# Altium footprint library 8-Crystals.PcbLib: 104 footprints (part 1 of 7)
Each footprint in its own frame and in the unit in brackets; x right, y up, seen from the top. Pads: shape width x height; smd on the part's side, far side on the other; paste and mask are expansions set on the pad; w line width, h text height; cw(c..) or ccw(c..) is an arc to the next point about the centre after c.
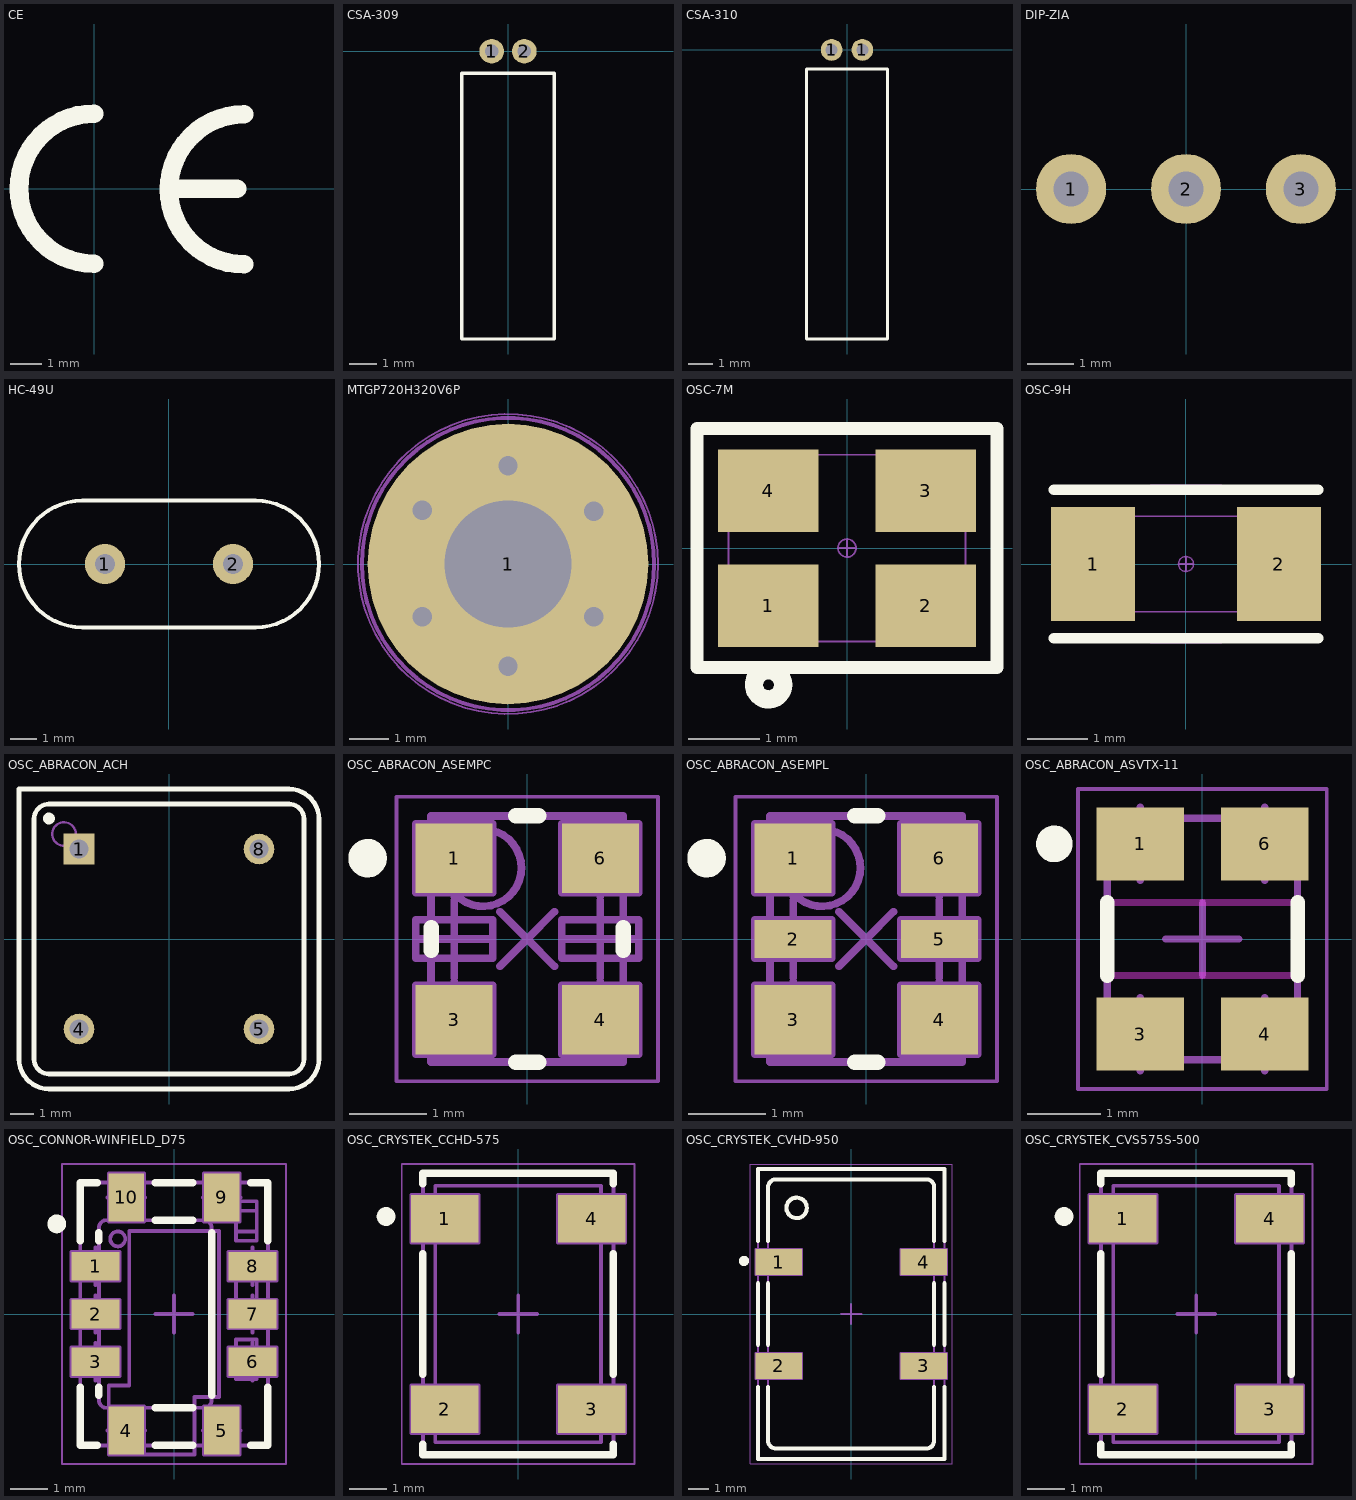
[diagram p0: the footprints below, top view; thin cyan lines are the x and y axes]

## CE [mm]
Top Overlay:
  lines w0.6: 0,-2.413 cw(c0,0) 0,2.413 ; 2.53,0 4.6,0 ; 4.826,-2.438 cw(c4.826,-0.025) 4.826,2.388
3D body "ce.stp": height 0.02, standoff 0, extent -2.725,-2.725 4.82,2.725

## CSA-309 [mm]
height 5.98
pads (2):
  round 0.9 hole 0.5: 1(-0.6,-0.004) 2(0.6,-0.004)
Top Overlay:
  lines w0.127: -1.702,-10.541 -1.702,-0.8 1.702,-0.8 1.702,-10.541 -1.702,-10.541
3D body "csa-309.stp": height 3.2, standoff -3.04, extent -1.625,-10.455 1.574,0.054
3D body "v090-050.stp": height 0.02, standoff -1.65, extent -1.05,-0.454 -0.15,0.446
3D body "v090-050.stp": height 0.02, standoff -1.65, extent 0.15,-0.453 1.05,0.446

## CSA-310 [mm]
height 5.98
pads (2):
  round 0.9 hole 0.5: 1(-0.635,0) 1(0.635,0)
Top Overlay:
  lines w0.127: -1.676,-11.963 1.676,-11.963 1.676,-0.8 -1.676,-0.8 -1.676,-11.963
3D body "v090-050.stp": height 0.02, standoff -1.65, extent 0.185,-0.45 1.085,0.45
3D body "v090-050.stp": height 0.02, standoff -1.65, extent -1.085,-0.45 -0.185,0.45
3D body "csa-310l.stp": height 3.2, standoff -3.04, extent -1.6,-11.905 1.6,0.105

## DIP-ZIA [mil]
height 235.43
pads (3):
  round 60 hole 30: 1(-98.43,0) 2(0,0) 3(98.43,0)
3D body "dip-zia.stp": height 259.84, standoff -98.43, extent -127.94,-59.05 127.96,59.06

## HC-49U [mil]
height 235.43
pads (2):
  round 60 hole 30: 1(-96.06,0) 2(96.06,0)
Top Overlay:
  lines w5.91: -130,-95.02 cw(c-130,0) -130,95.02 130,95.02 cw(c130.06,0) 130,-95.02 -130,-95.02
3D body "hc-49-us.stp": height 144.88, standoff -98.43, extent -220.07,-92.51 220.09,92.52

## MTGP720H320V6P [mm]
pads (1):
  round 7.2 hole 3.25: 1(0,0)
via -2.2,-1.35 diameter 1 hole 0.5
via -2.2,1.375 diameter 1 hole 0.5
via 0,2.525 diameter 1 hole 0.5
via 2.2,1.35 diameter 1 hole 0.5
via 0,-2.625 diameter 1 hole 0.5
via 2.2,-1.35 diameter 1 hole 0.5
Mechanical 8:
  circle w0.1: c0,0 r2.6
  circle w0.1: c0,0 r3.75
  lines w0.1: -2.657,1.625 -2.224,1.375 ; -2.632,-1.6 -2.199,-1.35 ; -2.474,0.942 -2.224,1.375 ; -2.449,-0.917 -2.199,-1.35 ; -1.974,1.808 -2.224,1.375 ; -1.949,-1.783 -2.199,-1.35 ; -1.791,1.125 -2.224,1.375 ; -1.766,-1.1 -2.199,-1.35 ; -0.5,-2.625 0,-2.625 ; -0.5,0 0,0 ; -0.5,2.525 0,2.525 ; 0,-3.125 0,-2.625 ; 0,-2.125 0,-2.625 ; 0,-0.5 0,0 ; 0,0.5 0,0 ; 0,2.025 0,2.525 ; 0,3.025 0,2.525 ; 0.5,-2.625 0,-2.625 ; 0.5,0 0,0 ; 0.5,2.525 0,2.525 ; 1.766,-1.1 2.199,-1.35 ; 1.766,1.1 2.199,1.35 ; 1.949,-1.783 2.199,-1.35 ; 1.949,1.783 2.199,1.35 ; 2.449,-0.917 2.199,-1.35 ; 2.449,0.917 2.199,1.35 ; 2.632,-1.6 2.199,-1.35 ; 2.632,1.6 2.199,1.35
Mechanical 14:
  circle w0.1: c0,0 r3.75
Mechanical 15:
  circle w0.05: c0,0 r3.85
3D body "mtgp720h320v6p.stp": height 0.1, standoff -1.75, extent -3.627,-3.627 3.628,3.628

## OSC-7M [mm]
height 5.98
pads (4):
  rect 1.4x1.15 smd: 1(-1.1,-0.8) 2(1.1,-0.8) 3(1.1,0.8) 4(-1.1,0.8)
Top Overlay:
  circle w0.254: c-1.092,-1.905 r0.203
  lines w0.18: -2.09,-1.665 2.09,-1.665 2.09,1.665 -2.09,1.665 -2.09,-1.665
Mechanical 6:
  lines w0.18: -0.11,-1.665 0.11,-1.665 ; -0.11,1.665 0.11,1.665
Mechanical 16:
  circle w0.025: c0,0 r0.125
  circle w0.025: c-1,-0.8 r0.4
  lines w0.025: -0.125,0 0.125,0 ; 0,-0.125 0,0.125 ; -1.65,-1.3 1.65,-1.3 1.65,1.3 -1.65,1.3 -1.65,-1.3
Mechanical 18:
  text "1" at -1.415,-0.8 h0.79
  text "3" at 0.785,0.8 h0.79
  text "4" at -1.415,0.8 h0.79
  text "2" at 0.785,-0.8 h0.79
3D body "p140-115.stp": height 0.02, standoff 0, extent -1.8,-1.375 -0.4,-0.225
3D body "p140-115.stp": height 0.02, standoff 0, extent 0.4,-1.375 1.8,-0.225
3D body "p140-115.stp": height 0.02, standoff 0, extent 0.4,0.225 1.8,1.375
3D body "p140-115.stp": height 0.02, standoff 0, extent -1.8,0.225 -0.4,1.375
3D body "osc4m-arm.stp": height 0, standoff 0, extent 0.4,-1.4 1.8,-0.2
3D body "osc4m-arm.stp": height 0, standoff 0, extent -1.8,-1.4 -0.4,-0.2
3D body "osc4m-arm.stp": height 0, standoff 0, extent 0.4,0.2 1.8,1.4
3D body "osc4m-arm.stp": height 0, standoff 0, extent -1.8,0.2 -0.4,1.4
3D body "y_3225-4.stp": height 0.86, standoff -0.02, extent -1.6,-1.245 1.6,1.255

## OSC-9H [mil]
height 235.43
pads (2):
  rect 55x75 smd: 1(-61.02,0) 2(61.02,0)
Top Overlay:
  lines w7.09: -86.61,-48.82 86.61,-48.82 ; -86.61,48.82 86.61,48.82
Mechanical 6:
  lines w7.09: -22.1,-48.82 22.1,-48.82 ; -22.1,48.82 22.1,48.82
Mechanical 16:
  circle w1: c0,0 r4.92
  lines w1: -4.92,0 4.92,0 ; 0,-4.92 0,4.92 ; -82.68,-31.5 82.68,-31.5 82.68,31.5 -82.68,31.5 -82.68,-31.5
Mechanical 18:
  text "2" at 73.41,0 h30.98
  text "1" at -48.63,0 h30.98
3D body "st3215sb.stp": height 31.5, standoff 0, extent -62.98,-29.52 63,29.53
3D body "osc9h-arm.stp": height 0.08, standoff 0, extent -88.58,-37.4 -33.46,37.4
3D body "osc9h-arm.stp": height 0.08, standoff 0, extent 33.46,-37.4 88.58,37.4

## OSC_ABRACON_ACH [mm] "Oscillator DIP8, 4 Leads, Pitch 7.62 mm X 7.62mm; Body 12.7mm X 12.7mm"
height 6.39
pads (4):
  rect 1.3x1.3 hole 0.8: 1(-3.81,3.81)
  round 1.3 hole 0.8: 4(-3.81,-3.81) 5(3.81,-3.81) 8(3.81,3.81)
Top Overlay:
  circle w0.25: c-5.081,5.101 r0.125
  lines w0.2: -6.35,-5.08 ccw(c-5.08,-5.08) -5.08,-6.35 5.08,-6.35 ccw(c5.08,-5.08) 6.35,-5.08 6.35,5.08 ccw(c5.08,5.08) 5.08,6.35 -6.35,6.35 -6.35,-5.08 ; -5.715,-5.08 ccw(c-5.08,-5.08) -5.08,-5.715 5.08,-5.715 ccw(c5.08,-5.08) 5.715,-5.08 5.715,5.08 ccw(c5.08,5.08) 5.08,5.715 -5.08,5.715 ccw(c-5.08,5.08) -5.715,5.08 -5.715,-5.08
Mechanical 14:
  circle w0.1: c-4.445,4.445 r0.5
  lines w0.1: -6.35,-5.08 ccw(c-5.08,-5.08) -5.08,-6.35 5.08,-6.35 ccw(c5.08,-5.08) 6.35,-5.08 6.35,5.08 ccw(c5.08,5.08) 5.08,6.35 -6.35,6.35 -6.35,-5.08 ; -5.715,-5.08 ccw(c-5.08,-5.08) -5.08,-5.715 5.08,-5.715 ccw(c5.08,-5.08) 5.715,-5.08 5.715,5.08 ccw(c5.08,5.08) 5.08,5.715 -5.08,5.715 ccw(c-5.08,5.08) -5.715,5.08 -5.715,-5.08
3D body "OSC_ABRACON_ACH.stp": height 6.39, standoff -3.6, extent -6.35,-6.35 6.35,6.35

## OSC_ABRACON_ASEMPC [mm] "4 Pins, 3.2x2.5mm, Performance Plastic Package Ultra Miniature Pure Silicon Clock Oscillator, ASEMP Serie CMOS Version"
height 0.9
pads (4):
  rect 1x0.9 smd: 1(-0.95,1.05) 3(-0.95,-1.05) 4(0.95,-1.05) 6(0.95,1.05)
Top Overlay:
  circle w0.25: c-2.075,1.05 r0.125
  lines w0.2: -1.25,-0.15 -1.25,0.15 ; -0.15,-1.6 0.15,-1.6 ; -0.15,1.6 0.15,1.6 ; 1.25,-0.15 1.25,0.15
Mechanical 8:
  lines w0.1: -1.45,-1.05 -0.95,-1.05 ; -1.45,0 -0.95,0 ; -1.45,1.05 -0.95,1.05 ; -0.95,-1.55 -0.95,-1.05 ; -0.95,-0.55 -0.95,-1.05 ; -0.95,-0.5 -0.95,0 ; -0.95,0.5 -0.95,0 ; -0.95,0.55 -0.95,1.05 ; -0.95,1.55 -0.95,1.05 ; -0.45,-1.05 -0.95,-1.05 ; -0.45,0 -0.95,0 ; -0.45,1.05 -0.95,1.05 ; -0.354,-0.354 0,0 ; -0.354,0.354 0,0 ; 0.354,-0.354 0,0 ; 0.354,0.354 0,0 ; 0.45,-1.05 0.95,-1.05 ; 0.45,0 0.95,0 ; 0.45,1.05 0.95,1.05 ; 0.95,-1.55 0.95,-1.05 ; 0.95,-0.55 0.95,-1.05 ; 0.95,-0.5 0.95,0 ; 0.95,0.5 0.95,0 ; 0.95,0.55 0.95,1.05 ; 0.95,1.55 0.95,1.05 ; 1.45,-1.05 0.95,-1.05 ; 1.45,0 0.95,0 ; 1.45,1.05 0.95,1.05 ; -1.45,-1.5 -1.45,-0.6 -0.45,-0.6 -0.45,-1.5 -1.45,-1.5 ; -1.45,-0.25 -0.45,-0.25 -0.45,0.25 -1.45,0.25 -1.45,-0.25 ; -1.45,0.6 -1.45,1.5 -0.45,1.5 -0.45,0.6 -1.45,0.6 ; 0.45,-1.5 0.45,-0.6 1.45,-0.6 1.45,-1.5 0.45,-1.5 ; 0.45,-0.25 1.45,-0.25 1.45,0.25 0.45,0.25 0.45,-0.25 ; 0.45,0.6 0.45,1.5 1.45,1.5 1.45,0.6 0.45,0.6
Mechanical 14:
  circle w0.1: c-0.575,0.925 r0.5
  lines w0.1: -1.25,-1.6 -1.25,1.6 1.25,1.6 1.25,-1.6 -1.25,-1.6
Mechanical 15:
  lines w0.05: -1.7,-1.85 1.7,-1.85 1.7,1.85 -1.7,1.85 -1.7,-1.85
3D body "OSC_ABRACON_ASEMPC.stp": height 1, standoff 0, extent -1.25,-1.6 1.25,1.6
3D body "p100-090.stp": height 0.02, standoff 0, extent -1.45,0.6 -0.45,1.5
3D body "p100-090.stp": height 0.02, standoff 0, extent 0.45,0.6 1.45,1.5
3D body "p100-090.stp": height 0.02, standoff 0, extent 0.45,-1.5 1.45,-0.6
3D body "p100-090.stp": height 0.02, standoff 0, extent -1.45,-1.5 -0.45,-0.6

## OSC_ABRACON_ASEMPL [mm] "6 Pins, 3.2x2.5mm, Performance Plastic Package Ultra Miniature Pure Silicon Clock Oscillator ASEMP Serie"
height 0.9
pads (6):
  rect 1x0.9 smd: 1(-0.95,1.05) 3(-0.95,-1.05) 4(0.95,-1.05) 6(0.95,1.05)
  rect 1x0.5 smd: 2(-0.95,0) 5(0.95,0)
Top Overlay:
  circle w0.25: c-2.075,1.05 r0.125
  lines w0.2: -0.15,-1.6 0.15,-1.6 ; -0.15,1.6 0.15,1.6
Mechanical 8:
  lines w0.1: -1.45,-1.05 -0.95,-1.05 ; -1.45,0 -0.95,0 ; -1.45,1.05 -0.95,1.05 ; -0.95,-1.55 -0.95,-1.05 ; -0.95,-0.55 -0.95,-1.05 ; -0.95,-0.5 -0.95,0 ; -0.95,0.5 -0.95,0 ; -0.95,0.55 -0.95,1.05 ; -0.95,1.55 -0.95,1.05 ; -0.45,-1.05 -0.95,-1.05 ; -0.45,0 -0.95,0 ; -0.45,1.05 -0.95,1.05 ; -0.354,-0.354 0,0 ; -0.354,0.354 0,0 ; 0.354,-0.354 0,0 ; 0.354,0.354 0,0 ; 0.45,-1.05 0.95,-1.05 ; 0.45,0 0.95,0 ; 0.45,1.05 0.95,1.05 ; 0.95,-1.55 0.95,-1.05 ; 0.95,-0.55 0.95,-1.05 ; 0.95,-0.5 0.95,0 ; 0.95,0.5 0.95,0 ; 0.95,0.55 0.95,1.05 ; 0.95,1.55 0.95,1.05 ; 1.45,-1.05 0.95,-1.05 ; 1.45,0 0.95,0 ; 1.45,1.05 0.95,1.05 ; -1.45,-1.5 -0.45,-1.5 -0.45,-0.6 -1.45,-0.6 -1.45,-1.5 ; -1.45,-0.25 -1.45,0.25 -0.45,0.25 -0.45,-0.25 -1.45,-0.25 ; -1.45,0.6 -0.45,0.6 -0.45,1.5 -1.45,1.5 -1.45,0.6 ; 0.45,-1.5 1.45,-1.5 1.45,-0.6 0.45,-0.6 0.45,-1.5 ; 0.45,-0.25 0.45,0.25 1.45,0.25 1.45,-0.25 0.45,-0.25 ; 0.45,0.6 1.45,0.6 1.45,1.5 0.45,1.5 0.45,0.6
Mechanical 14:
  circle w0.1: c-0.575,0.925 r0.5
  lines w0.1: -1.25,-1.6 1.25,-1.6 1.25,1.6 -1.25,1.6 -1.25,-1.6
Mechanical 15:
  lines w0.05: -1.7,-1.85 -1.7,1.85 1.7,1.85 1.7,-1.85 -1.7,-1.85
3D body "p100-050.stp": height 0.02, standoff 0, extent 0.45,-0.25 1.45,0.25
3D body "p100-050.stp": height 0.02, standoff 0, extent -1.45,-0.25 -0.45,0.25
3D body "p100-090.stp": height 0.02, standoff 0, extent 0.45,-1.5 1.45,-0.6
3D body "p100-090.stp": height 0.02, standoff 0, extent -1.45,-1.5 -0.45,-0.6
3D body "p100-090.stp": height 0.02, standoff 0, extent 0.45,0.6 1.45,1.5
3D body "p100-090.stp": height 0.02, standoff 0, extent -1.45,0.6 -0.45,1.5
3D body "OSC_ABRACON_ASEMPL.stp": height 1, standoff 0, extent -1.25,-1.6 1.25,1.6

## OSC_ABRACON_ASVTX-11 [mm] "Voltage Controlled Temperature Compensated Crystal Oscillator ASVTX-11  Serie, SMD Oscillator, 4 pins, 3.2x2.5mm"
height 1
pads (4):
  rect 1.2x1 smd: 1(-0.85,1.3) 3(-0.85,-1.3) 4(0.85,-1.3) 6(0.85,1.3)
Top Layer keep-out:
  lines w0.1: -1.3,-0.5 1.3,-0.5 1.3,0.5 -1.3,0.5 -1.3,-0.5
Top Overlay:
  circle w0.25: c-2.025,1.3 r0.125
  lines w0.2: -1.3,-0.5 -1.3,0.5 ; 1.3,-0.5 1.3,0.5
Mechanical 8:
  lines w0.1: -1.35,-1.3 -0.85,-1.3 ; -1.35,1.3 -0.85,1.3 ; -0.85,-1.8 -0.85,-1.3 ; -0.85,-0.8 -0.85,-1.3 ; -0.85,0.8 -0.85,1.3 ; -0.85,1.8 -0.85,1.3 ; -0.5,0 0,0 ; -0.35,-1.3 -0.85,-1.3 ; -0.35,1.3 -0.85,1.3 ; 0,-0.5 0,0 ; 0,0.5 0,0 ; 0.35,-1.3 0.85,-1.3 ; 0.35,1.3 0.85,1.3 ; 0.5,0 0,0 ; 0.85,-1.8 0.85,-1.3 ; 0.85,-0.8 0.85,-1.3 ; 0.85,0.8 0.85,1.3 ; 0.85,1.8 0.85,1.3 ; 1.35,-1.3 0.85,-1.3 ; 1.35,1.3 0.85,1.3
Mechanical 14:
  circle w0.1: c-0.85,1.3 r0.2
  lines w0.1: -1.3,-1.65 -1.3,1.65 1.3,1.65 1.3,-1.65 -1.3,-1.65
Mechanical 15:
  lines w0.05: -1.7,-2.05 -1.7,2.05 1.7,2.05 1.7,-2.05 -1.7,-2.05
3D body "p120-100.stp": height 0.02, standoff 0, extent 0.25,0.8 1.45,1.8
3D body "p120-100.stp": height 0.02, standoff 0, extent -1.45,0.8 -0.25,1.8
3D body "p120-100.stp": height 0.02, standoff 0, extent 0.25,-1.8 1.45,-0.8
3D body "p120-100.stp": height 0.02, standoff 0, extent -1.45,-1.8 -0.25,-0.8
3D body "OSC_ABRACON_ASVTX-11.stp": height 1, standoff 0, extent -1.3,-1.65 1.3,1.65

## OSC_CONNOR-WINFIELD_D75 [mm] "SMD TCXO, Side Concave, 10 pins, 5.00x7.00mm, D75 Serie"
height 2
pads (10):
  rect 1.28x0.76 smd: 1(-2.09,1.27) 2(-2.09,0) 3(-2.09,-1.27) 6(2.09,-1.27) 7(2.09,0) 8(2.09,1.27)
  rect 0.94x1.28 smd: 4(-1.27,-3.105) 5(1.27,-3.105) 9(1.27,3.105) 10(-1.27,3.105)
Top Overlay:
  circle w0.25: c-3.125,2.4 r0.125
  lines w0.2: -2.5,-1.95 -2.5,-3.5 -2.04,-3.5 ; -2.5,1.95 -2.5,3.5 -2.04,3.5 ; -2,-2.165 -2,-1.95 ; -2,1.95 -2,2.165 ; -0.5,-3.5 0.5,-3.5 ; -0.5,-2.5 0.5,-2.5 ; -0.5,2.5 0.5,2.5 ; -0.5,3.5 0.5,3.5 ; 1,-2.165 1,2.165 ; 2.04,-3.5 2.5,-3.5 2.5,-1.95 ; 2.04,3.5 2.5,3.5 2.5,1.95
Mechanical 8:
  lines w0.1: -2.59,-1.27 -2.09,-1.27 ; -2.59,0 -2.09,0 ; -2.59,1.27 -2.09,1.27 ; -2.09,-1.77 -2.09,-1.27 ; -2.09,-0.77 -2.09,-1.27 ; -2.09,-0.5 -2.09,0 ; -2.09,0.5 -2.09,0 ; -2.09,0.77 -2.09,1.27 ; -2.09,1.77 -2.09,1.27 ; -1.77,-3.105 -1.27,-3.105 ; -1.77,3.105 -1.27,3.105 ; -1.59,-1.27 -2.09,-1.27 ; -1.59,0 -2.09,0 ; -1.59,1.27 -2.09,1.27 ; -1.27,-3.605 -1.27,-3.105 ; -1.27,-2.605 -1.27,-3.105 ; -1.27,2.605 -1.27,3.105 ; -1.27,3.605 -1.27,3.105 ; -0.77,-3.105 -1.27,-3.105 ; -0.77,3.105 -1.27,3.105 ; -0.5,0 0,0 ; 0,-0.5 0,0 ; 0,0.5 0,0 ; 0.5,0 0,0 ; 0.77,-3.105 1.27,-3.105 ; 0.77,3.105 1.27,3.105 ; 1.27,-3.605 1.27,-3.105 ; 1.27,-2.605 1.27,-3.105 ; 1.27,2.605 1.27,3.105 ; 1.27,3.605 1.27,3.105 ; 1.59,-1.27 2.09,-1.27 ; 1.59,0 2.09,0 ; 1.59,1.27 2.09,1.27 ; 1.77,-3.105 1.27,-3.105 ; 1.77,3.105 1.27,3.105 ; 2.09,-1.77 2.09,-1.27 ; 2.09,-0.77 2.09,-1.27 ; 2.09,-0.5 2.09,0 ; 2.09,0.5 2.09,0 ; 2.09,0.77 2.09,1.27 ; 2.09,1.77 2.09,1.27 ; 2.59,-1.27 2.09,-1.27 ; 2.59,0 2.09,0 ; 2.59,1.27 2.09,1.27 ; -1.74,-3.745 -0.8,-3.745 ; -1.74,-3.745 -1.74,-2.465 ; -1.74,-3.745 -1.74,-2.465 ; -1.74,-3.745 -0.8,-3.745 ; -1.74,-2.465 -1.74,-1.904 -1.196,-1.904 -1.196,2.211 1.196,2.211 1.196,-2.211 0.546,-2.211 0.546,-3.745 -0.8,-3.745 ; -1.74,-2.465 -0.8,-2.465 -0.8,-3.745 ; -2.73,-1.65 -1.45,-1.65 -1.45,-0.89 -2.73,-0.89 -2.73,-1.65 ; -2.73,-0.38 -1.45,-0.38 -1.45,0.38 -2.73,0.38 -2.73,-0.38 ; -2.73,0.89 -1.45,0.89 -1.45,1.65 -2.73,1.65 -2.73,0.89 ; -1.74,2.465 -0.8,2.465 -0.8,3.745 -1.74,3.745 -1.74,2.465 ; 0.8,-3.745 0.8,-2.465 1.74,-2.465 1.74,-3.745 0.8,-3.745 ; 0.8,2.465 1.74,2.465 1.74,3.745 0.8,3.745 0.8,2.465 ; 1.45,-1.65 1.45,-0.89 2.73,-0.89 2.73,-1.65 1.45,-1.65 ; 1.45,-0.38 1.45,0.38 2.73,0.38 2.73,-0.38 1.45,-0.38 ; 1.45,0.89 1.45,1.65 2.73,1.65 2.73,0.89 1.45,0.89
Mechanical 14:
  circle w0.1: c-1.5,2 r0.2
  lines w0.1: 1.556,-3.5 1.651,-3.5 ; 1.65,-1.48 2.2,-1.48 ; 1.65,-0.93 2.2,-0.93 ; 1.65,0.36 2.2,0.36 ; 1.65,0.91 2.2,0.91 ; 1.65,2.2 2.2,2.2 ; 1.651,2.75 2.2,2.75 ; -2.5,-3.5 -2.5,-1.508 ccw(c-2.5,-1.27) -2.5,-1.032 -2.5,-0.238 ccw(c-2.5,0) -2.5,0.238 -2.5,1.032 ccw(c-2.5,1.27) -2.5,1.508 -2.5,3.5 -1.581,3.5 ccw(c-1.27,3.5) -0.959,3.5 0.959,3.5 ccw(c1.27,3.5) 1.581,3.5 2.5,3.5 2.5,1.508 ccw(c2.5,1.27) 2.5,1.032 2.5,0.238 ccw(c2.5,0) 2.5,-0.238 2.5,-1.032 ccw(c2.5,-1.27) 2.5,-1.508 2.5,-3.5 1.581,-3.5 ccw(c1.27,-3.5) 0.959,-3.5 -0.959,-3.5 ccw(c-1.27,-3.5) -1.581,-3.5 -2.5,-3.5 ; -2,-2.3 ccw(c-1.8,-2.3) -1.8,-2.5 0.8,-2.5 ccw(c0.8,-2.3) 1,-2.3 1,2.3 ccw(c0.8,2.3) 0.8,2.5 -1.8,2.5 ccw(c-1.8,2.3) -2,2.3 -2,-2.3 ; 1.65,-1.73 1.65,-0.68 2.2,-0.68 2.2,-1.73 1.65,-1.73 ; 1.65,0.11 1.65,1.16 2.2,1.16 2.2,0.11 1.65,0.11 ; 1.651,1.95 2.2,1.95 2.2,3 1.651,3 1.651,1.95
Mechanical 15:
  lines w0.05: -2.98,-3.995 -2.98,3.995 2.98,3.995 2.98,-3.995 -2.98,-3.995
3D body "p128-094.stp": height 0.02, standoff 0, extent 0.8,-3.745 1.74,-2.465
3D body "p128-094.stp": height 0.02, standoff 0, extent -1.74,-3.745 -0.8,-2.465
3D body "p128-094.stp": height 0.02, standoff 0, extent 0.8,2.465 1.74,3.745
3D body "p128-094.stp": height 0.02, standoff 0, extent -1.74,2.465 -0.8,3.745
3D body "p128-076.stp": height 0.02, standoff 0, extent 1.45,0.89 2.73,1.65
3D body "p128-076.stp": height 0.02, standoff 0, extent 1.45,-0.38 2.73,0.38
3D body "p128-076.stp": height 0.02, standoff 0, extent 1.45,-1.65 2.73,-0.89
3D body "p128-076.stp": height 0.02, standoff 0, extent -2.73,-1.65 -1.45,-0.89
3D body "p128-076.stp": height 0.02, standoff 0, extent -2.73,-0.38 -1.45,0.38
3D body "p128-076.stp": height 0.02, standoff 0, extent -2.73,0.89 -1.45,1.65
3D body "OSC_CONNOR-WINFIELD_D75.stp": height 2, standoff 0, extent -2.5,-3.5 2.5,3.5

## OSC_CRYSTEK_CCHD-575 [mm] "Oscillator, 5.08mm Pitch; 4 Pin, 5.08mm L X 7.5mm W X 2.5mm H, CCHD-575 Serie"
height 2.5
pads (4):
  rect 1.8x1.27 smd: 1(-1.955,2.54) 2(-1.955,-2.54) 3(1.955,-2.54) 4(1.955,2.54)
Top Overlay:
  circle w0.25: c-3.525,2.6 r0.125
  lines w0.2: -2.54,-3.475 -2.54,-3.75 2.54,-3.75 2.54,-3.475 ; -2.54,-1.605 -2.54,1.605 ; -2.54,3.475 -2.54,3.75 2.54,3.75 2.54,3.475 ; 2.54,-1.605 2.54,1.605
Mechanical 8:
  lines w0.1: -2.455,-2.54 -1.955,-2.54 ; -2.455,2.54 -1.955,2.54 ; -1.955,-3.04 -1.955,-2.54 ; -1.955,-2.04 -1.955,-2.54 ; -1.955,2.04 -1.955,2.54 ; -1.955,3.04 -1.955,2.54 ; -1.455,-2.54 -1.955,-2.54 ; -1.455,2.54 -1.955,2.54 ; -0.5,0 0,0 ; 0,-0.5 0,0 ; 0,0.5 0,0 ; 0.5,0 0,0 ; 1.455,-2.54 1.955,-2.54 ; 1.455,2.54 1.955,2.54 ; 1.955,-3.04 1.955,-2.54 ; 1.955,-2.04 1.955,-2.54 ; 1.955,2.04 1.955,2.54 ; 1.955,3.04 1.955,2.54 ; 2.455,-2.54 1.955,-2.54 ; 2.455,2.54 1.955,2.54 ; -2.855,-3.175 -1.055,-3.175 -1.055,-1.905 -2.855,-1.905 -2.855,-3.175 ; -2.855,1.905 -1.055,1.905 -1.055,3.175 -2.855,3.175 -2.855,1.905 ; 1.055,-3.175 2.855,-3.175 2.855,-1.905 1.055,-1.905 1.055,-3.175 ; 1.055,1.905 2.855,1.905 2.855,3.175 1.055,3.175 1.055,1.905
Mechanical 14:
  circle w0.1: c-1.555,2.55 r0.4
  lines w0.1: -2.54,-3.75 -2.54,3.75 2.54,3.75 2.54,-3.75 -2.54,-3.75 ; -2.21,-3.42 2.21,-3.42 2.21,3.42 -2.21,3.42 -2.21,-3.42
Mechanical 15:
  lines w0.05: -3.105,-4 -3.105,4 3.105,4 3.105,-4 -3.105,-4
3D body "p180-127.stp": height 0.02, standoff 0, extent -2.855,1.905 -1.055,3.175
3D body "p180-127.stp": height 0.02, standoff 0, extent 1.055,1.905 2.855,3.175
3D body "p180-127.stp": height 0.02, standoff 0, extent 1.055,-3.175 2.855,-1.905
3D body "p180-127.stp": height 0.02, standoff 0, extent -2.855,-3.175 -1.055,-1.905
3D body "OSC_CRYSTEK_CCHD-575.stp": height 2.5, standoff 0, extent -2.54,-3.75 2.54,3.75

## OSC_CRYSTEK_CVHD-950 [mm] "Oscillator, 5.08mm Pitch; 4 Pin, 14.2mm L X 9.14mm W X 5.3mm H, CVHD-950 Serie"
height 5.3
pads (4):
  rect 2.28x1.27 smd: 1(-3.555,2.54) 2(-3.555,-2.54) 3(3.555,-2.54) 4(3.555,2.54)
Top Overlay:
  circle w0.2: c-2.67,5.2 r0.5
  circle w0.25: c-5.25,2.6 r0.125
  lines w0.2: -4.57,-3.575 -4.57,-7.1 4.57,-7.1 4.57,-3.575 ; -4.57,-1.505 -4.57,1.505 ; -4.57,3.575 -4.57,7.1 4.57,7.1 4.57,3.575 ; -4.07,-3.575 -4.07,-6.2 ccw(c-3.67,-6.2) -3.67,-6.6 3.67,-6.6 ccw(c3.67,-6.2) 4.07,-6.2 4.07,-3.575 ; -4.07,-1.505 -4.07,1.505 ; -4.07,3.575 -4.07,6.2 cw(c-3.67,6.2) -3.67,6.6 3.67,6.6 cw(c3.67,6.2) 4.07,6.2 4.07,3.575 ; 4.07,-1.505 4.07,1.505 ; 4.57,-1.505 4.57,1.505
Mechanical 8:
  lines w0.1: -4.055,-2.54 -3.555,-2.54 ; -4.055,2.54 -3.555,2.54 ; -3.555,-3.04 -3.555,-2.54 ; -3.555,-2.04 -3.555,-2.54 ; -3.555,2.04 -3.555,2.54 ; -3.555,3.04 -3.555,2.54 ; -3.055,-2.54 -3.555,-2.54 ; -3.055,2.54 -3.555,2.54 ; -0.5,0 0,0 ; 0,-0.5 0,0 ; 0,0.5 0,0 ; 0.5,0 0,0 ; 3.055,-2.54 3.555,-2.54 ; 3.055,2.54 3.555,2.54 ; 3.555,-3.04 3.555,-2.54 ; 3.555,-2.04 3.555,-2.54 ; 3.555,2.04 3.555,2.54 ; 3.555,3.04 3.555,2.54 ; 4.055,-2.54 3.555,-2.54 ; 4.055,2.54 3.555,2.54 ; -4.695,-3.175 -4.695,-1.905 -2.415,-1.905 -2.415,-3.175 -4.695,-3.175 ; -4.695,1.905 -4.695,3.175 -2.415,3.175 -2.415,1.905 -4.695,1.905 ; 2.415,-3.175 2.415,-1.905 4.695,-1.905 4.695,-3.175 2.415,-3.175 ; 2.415,1.905 2.415,3.175 4.695,3.175 4.695,1.905 2.415,1.905
Mechanical 14:
  circle w0.1: c-2.67,5.2 r0.5
  lines w0.1: -4.57,-3.045 -4.07,-3.045 ; -4.57,-2.035 -4.07,-2.035 ; -4.57,2.035 -4.07,2.035 ; -4.57,3.045 -4.07,3.045 ; 4.07,-3.045 4.57,-3.045 ; 4.07,-2.035 4.57,-2.035 ; 4.07,2.035 4.57,2.035 ; 4.07,3.045 4.57,3.045 ; -4.57,-7.1 4.57,-7.1 4.57,-2.94 cw(c4.57,-2.54) 4.57,-2.14 4.57,2.14 cw(c4.57,2.54) 4.57,2.94 4.57,7.1 -4.57,7.1 -4.57,2.94 cw(c-4.57,2.54) -4.57,2.14 -4.57,-2.14 cw(c-4.57,-2.54) -4.57,-2.94 -4.57,-7.1 ; -4.07,-6.2 ccw(c-3.67,-6.2) -3.67,-6.6 3.67,-6.6 ccw(c3.67,-6.2) 4.07,-6.2 4.07,6.2 ccw(c3.67,6.2) 3.67,6.6 -3.67,6.6 ccw(c-3.67,6.2) -4.07,6.2 -4.07,-6.2
Mechanical 15:
  lines w0.05: -4.945,-7.35 -4.945,7.35 4.945,7.35 4.945,-7.35 -4.945,-7.35
3D body "p228-127.stp": height 0.02, standoff 0, extent 2.414,1.905 4.694,3.175
3D body "p228-127.stp": height 0.02, standoff 0, extent 2.414,-3.175 4.694,-1.905
3D body "p228-127.stp": height 0.02, standoff 0, extent -4.696,-3.175 -2.416,-1.905
3D body "p228-127.stp": height 0.02, standoff 0, extent -4.696,1.905 -2.416,3.175
3D body "OSC_CRYSTEK_CVHD-950.stp": height 5.3, standoff 0, extent -4.57,-7.1 4.57,7.1

## OSC_CRYSTEK_CVS575S-500 [mm] "VCO, 5.08mm Pitch; 4 Pin, 5.08mm L X 7.5mm W X 2.5mm H"
height 2.5
pads (4):
  rect 1.8x1.27 smd: 1(-1.955,2.54) 2(-1.955,-2.54) 3(1.955,-2.54) 4(1.955,2.54)
Top Overlay:
  circle w0.25: c-3.525,2.6 r0.125
  lines w0.2: -2.54,-3.475 -2.54,-3.75 2.54,-3.75 2.54,-3.475 ; -2.54,-1.605 -2.54,1.605 ; -2.54,3.475 -2.54,3.75 2.54,3.75 2.54,3.475 ; 2.54,-1.605 2.54,1.605
Mechanical 8:
  lines w0.1: -2.455,-2.54 -1.955,-2.54 ; -2.455,2.54 -1.955,2.54 ; -1.955,-3.04 -1.955,-2.54 ; -1.955,-2.04 -1.955,-2.54 ; -1.955,2.04 -1.955,2.54 ; -1.955,3.04 -1.955,2.54 ; -1.455,-2.54 -1.955,-2.54 ; -1.455,2.54 -1.955,2.54 ; -0.5,0 0,0 ; 0,-0.5 0,0 ; 0,0.5 0,0 ; 0.5,0 0,0 ; 1.455,-2.54 1.955,-2.54 ; 1.455,2.54 1.955,2.54 ; 1.955,-3.04 1.955,-2.54 ; 1.955,-2.04 1.955,-2.54 ; 1.955,2.04 1.955,2.54 ; 1.955,3.04 1.955,2.54 ; 2.455,-2.54 1.955,-2.54 ; 2.455,2.54 1.955,2.54 ; -2.855,-3.175 -1.055,-3.175 -1.055,-1.905 -2.855,-1.905 -2.855,-3.175 ; -2.855,1.905 -1.055,1.905 -1.055,3.175 -2.855,3.175 -2.855,1.905 ; 1.055,-3.175 2.855,-3.175 2.855,-1.905 1.055,-1.905 1.055,-3.175 ; 1.055,1.905 2.855,1.905 2.855,3.175 1.055,3.175 1.055,1.905
Mechanical 14:
  circle w0.1: c-1.555,2.55 r0.4
  lines w0.1: -2.54,-3.75 -2.54,3.75 2.54,3.75 2.54,-3.75 -2.54,-3.75 ; -2.21,-3.42 2.21,-3.42 2.21,3.42 -2.21,3.42 -2.21,-3.42
Mechanical 15:
  lines w0.05: -3.105,-4 -3.105,4 3.105,4 3.105,-4 -3.105,-4
3D body "p180-127.stp": height 0.02, standoff 0, extent 1.055,-3.175 2.855,-1.905
3D body "p180-127.stp": height 0.02, standoff 0, extent -2.855,-3.175 -1.055,-1.905
3D body "p180-127.stp": height 0.02, standoff 0, extent 1.055,1.905 2.855,3.175
3D body "p180-127.stp": height 0.02, standoff 0, extent -2.855,1.905 -1.055,3.175
3D body "OSC_CRYSTEK_CVS575S-500.stp": height 2.5, standoff 0, extent -2.54,-3.75 2.54,3.75